# Altium footprint library MH_DA_THU_VIEN_16122016.PcbLib: 531 footprints (part 21 of 34)
Each footprint in its own frame and in the unit in brackets; x right, y up, seen from the top. Pads: shape width x height; smd on the part's side, far side on the other; paste and mask are expansions set on the pad; w line width, h text height; cw(c..) or ccw(c..) is an arc to the next point about the centre after c.
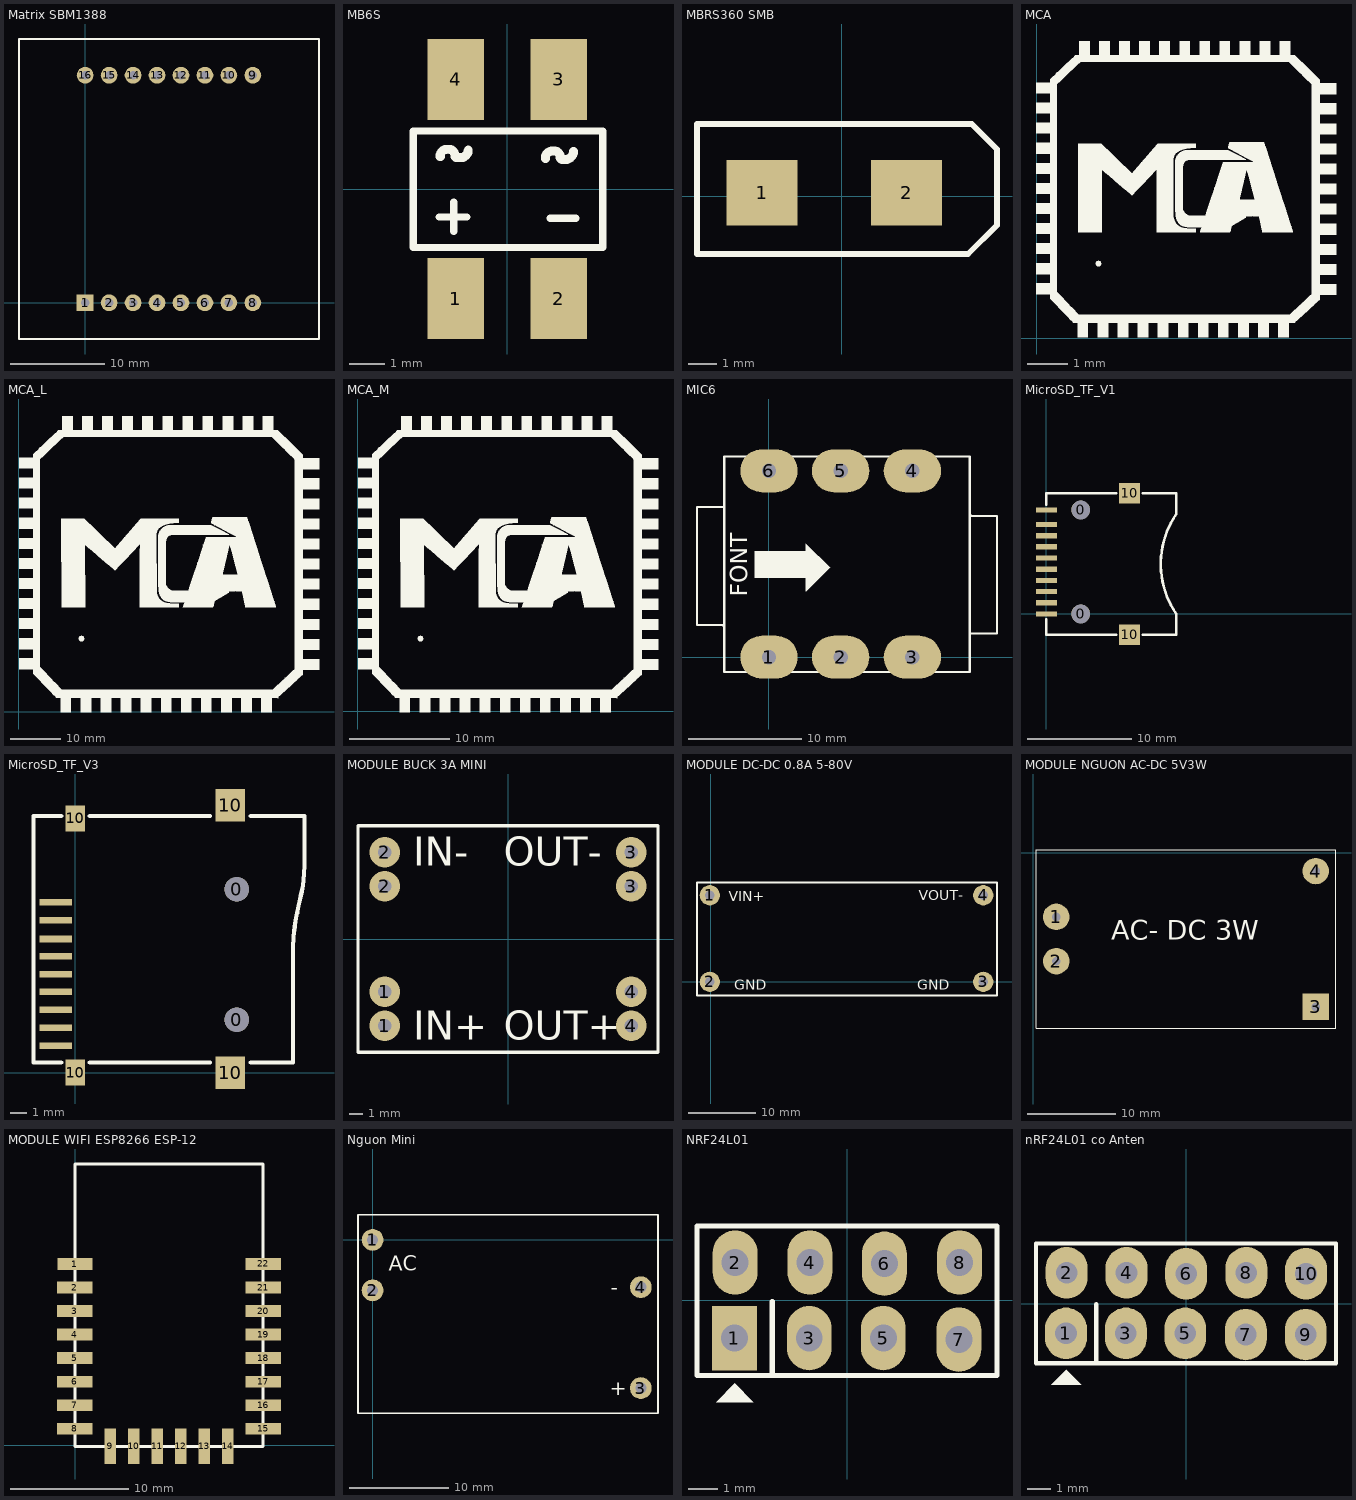
[diagram p20: the footprints below, top view; thin cyan lines are the x and y axes]

## Matrix SBM1388 [mil] "Matrix 8x8"
pads (16):
  rect 70x70 hole 35: 1(-1.1,0)
  round 70 hole 35: 2(98.9,0) 3(198.9,0) 4(298.9,0) 5(398.9,0) 6(498.9,0) 7(598.9,0) 8(698.9,0) 9(698.9,950) 10(598.9,950) 11(498.9,950) 12(398.9,950) 13(298.9,950) 14(198.9,950) 15(98.9,950) 16(-1.1,950)
Top Overlay:
  lines w10: -277.08,-150.98 -277.08,1100.98 974.88,1100.98 974.88,-150.98 -277.08,-150.98

## MB6S [mm]
pads (4):
  rect 1.6x2.3 smd: 1(-1.46,-3.111) 2(1.46,-3.111) 3(1.46,3.111) 4(-1.46,3.111)
Top Overlay:
  lines w0.203: -1.935,-0.8 -1.14,-0.8 ; -1.52,-1.21 -1.52,-0.369 ; 1.22,-0.83 1.95,-0.83 ; -2.67,-1.66 -2.67,1.65 2.71,1.65 2.71,-1.66 -2.67,-1.66
  lines w0.254: -1.9,0.92 cw(c-1.9,0.93) -1.91,0.93 cw(c-1.71,0.93) -1.71,1.13 -1.66,1.13 cw(c-1.66,0.96) -1.49,0.96 ccw(c-1.42,0.96) -1.42,0.89 -1.33,0.89 ccw(c-1.33,1.11) -1.11,1.11 ; 1.09,0.87 cw(c1.09,0.88) 1.08,0.88 cw(c1.28,0.88) 1.28,1.08 1.33,1.08 cw(c1.33,0.91) 1.5,0.91 ccw(c1.57,0.91) 1.57,0.84 1.66,0.84 ccw(c1.66,1.06) 1.88,1.06

## MBRS360 SMB [mm]
pads (2):
  rect 2.5x2.3 smd: 1(-2.794,0.127) 2(2.286,0.127)
Top Overlay:
  lines w0.203: -5.08,-2.032 4.445,-2.032 5.461,-1.016 5.461,1.651 4.572,2.54 -5.08,2.54 -5.08,-2.032
3D body: height 1.03, standoff -0.03, extent -3.011,-1.673 2.249,1.927

## MCA [mm] "MCA_Microcontroller Academy"
Top Overlay:
  drawing of 4940 lines, arcs and shapes, not listed

## MCA_L [mm]
Top Overlay:
  drawing of 4947 lines, arcs and shapes, not listed

## MCA_M [mm]
Top Overlay:
  drawing of 4947 lines, arcs and shapes, not listed

## MIC6 [mm] "Jac Mic 6 pin to"
pads (6):
  oval 5.08x3.81 hole 1.27: 1(0,0) 2(6.35,0) 3(12.7,0) 4(12.7,16.51) 5(6.35,16.51) 6(0,16.51)
Top Overlay:
  region: -1.27,9.373 -1.27,7.036 3.302,7.036 3.277,7.061 3.277,5.842 3.302,5.842 5.385,7.925 5.41,7.925 3.277,10.058 3.277,9.373
  lines w0.178: -3.962,-1.295 -3.962,17.755 ; -3.962,2.261 -3.962,13.335 -4.013,13.284 -6.375,13.284 -6.375,2.845 -4.115,2.845 -3.962,2.692 ; -3.962,17.78 17.78,17.78 17.78,14.986 ; -3.937,-1.321 -3.912,-1.295 -3.886,-1.321 17.78,-1.321 17.78,2.083 ; 17.78,12.675 17.932,12.522 20.193,12.522 20.193,2.083 17.831,2.083 17.78,2.032 17.78,15.088
  text "FONT" at -1.905,5.334 h1.52

## MicroSD_TF_V1 [mm]
pads (14):
  round 1.8 hole 1.8: 0(3.3,0) 0(3.3,10)
  rect 2x0.5 smd: 1(0,7.525) 2(0,6.45) 3(0,5.375) 4(0,4.3) 5(0,3.225) 6(0,2.15) 7(0,1.075) 8(0,0) 9(0,8.6) 10(0,10)
  rect 2x2 smd: 10(8,-2) 10(8,11.6)
Top Overlay:
  lines w0.254: 0,-0.5 0,-2 6.7,-2 ; 0,10.5 0,11.6 6.7,11.6 ; 9.3,-2 12.5,-2 12.5,0 cw(c19.43,4.8) 12.5,9.6 12.5,11.6 9.3,11.6

## MicroSD_TF_V3 [mm]
pads (15):
  round 1.5 hole 1.5: 0(9.9,3.25) 0(9.9,11.25)
  rect 2x0.4 smd: 1(-1.2,10.45) 2(-1.2,9.35) 3(-1.2,8.2) 4(-1.2,7.15) 5(-1.2,6.05) 6(-1.2,4.95) 7(-1.2,3.85) 8(-1.2,2.75) 9(-1.2,1.65)
  rect 1.2x1.6 smd: 10(0,0) 10(0,15.6)
  rect 1.8x2 smd: 10(9.5,0) 10(9.5,16.4)
Top Overlay:
  lines w0.254: -0.875,0.625 -2.575,0.625 -2.575,15.75 -0.875,15.75 ; 0.875,0.625 8.25,0.625 ; 0.875,15.75 8.25,15.75 ; 10.75,0.625 13.35,0.625 13.35,7.65 13.375,8.35 13.45,8.975 13.5,9.325 13.6,9.8 13.75,10.5 13.85,10.975 13.95,11.475 14.025,12.175 14.05,12.75 14.05,15.75 10.75,15.75
Bottom Solder:
  circle w0.013: c9.9,3.25 r0.6
  circle w0.013: c9.9,11.25 r0.6
3D body: height 1.86, standoff -0.59, extent -1.385,0.189 13.865,16.189

## MODULE BUCK 3A MINI [mil]
pads (8):
  round 90 hole 40: 1(-364.17,-255.91) 1(-364.17,-155.91) 2(-364.17,155.91) 2(-364.17,255.91) 3(364.17,155.91) 3(364.17,255.91) 4(364.17,-255.91) 4(364.17,-155.91)
Top Overlay:
  lines w10: -442.91,-334.65 442.91,-334.65 442.91,334.65 -442.91,334.65 -442.91,-334.65
  text "OUT+" at -12,-298 h85
  text "OUT-" at -12,216 h85
  text "IN-" at -280,216 h85
  text "IN+" at -280,-298 h85

## MODULE DC-DC 0.8A 5-80V [mm]
pads (4):
  round 3 hole 1.4: 1(-0.127,12.827) 2(-0.127,0) 3(40.386,0) 4(40.386,12.827)
Top Overlay:
  lines w0.254: -2.032,-2.032 -2.032,14.732 42.418,14.732 42.418,-2.032 -2.032,-2.032
  text "VIN+" at 2.667,11.938 h1.52
  text "GND" at 3.523,-1.143 h1.52
  text "GND" at 30.607,-1.143 h1.52
  text "VOUT-" at 30.861,12.065 h1.52

## MODULE NGUON AC-DC 5V3W [mm]
pads (4):
  round 3 hole 1: 1(2.61,-7.29) 2(2.62,-12.31) 4(32.02,-2.1)
  rect 3x3 hole 1: 3(32.02,-17.49)
Top Overlay:
  circle w0.025: c2.618,-7.298 r1
  circle w0.025: c2.618,-12.298 r1
  circle w0.025: c32.018,-2.098 r1
  circle w0.025: c32.018,-17.498 r1
  lines w0.025: 1.618,-12.298 3.618,-12.298 ; 1.618,-7.298 3.618,-7.298 ; 2.618,-13.298 2.618,-11.298 ; 2.618,-8.298 2.618,-6.298 ; 31.018,-17.498 33.018,-17.498 ; 31.018,-2.098 33.018,-2.098 ; 32.018,-18.498 32.018,-16.498 ; 32.018,-3.098 32.018,-1.098 ; 0.318,-19.898 34.318,-19.898 34.318,0.302 0.318,0.302 0.318,-19.898
  text "AC- DC 3W" at 8.86,-10.61 h3.81

## MODULE WIFI ESP8266 ESP-12 [mm] "MODULE WIFI ESP8266 ESP-12"
pads (22):
  rect 3x1 smd: 1(-0.01,15.39) 2(-0.02,13.4) 3(-0.02,11.4) 4(-0.02,9.4) 5(-0.02,7.4) 6(-0.02,5.4) 7(-0.02,3.4) 8(-0.02,1.4) 15(15.98,1.4) 16(15.98,3.4) 17(15.98,5.4) 18(15.98,7.4) 19(15.98,9.4) 20(15.98,11.4) 21(15.98,13.4) 22(15.98,15.4)
  rect 1x3 smd: 9(2.98,-0.1) 10(4.98,-0.1) 11(6.98,-0.1) 12(8.98,-0.1) 13(10.98,-0.1) 14(12.98,-0.1)
Top Overlay:
  lines w0.254: -0.02,-0.102 -0.02,23.898 15.98,23.898 15.98,-0.102 -0.02,-0.102
3D body: height 2.65, standoff -0.04, extent -0.035,-0.125 15.975,23.88

## Nguon Mini [mm]
pads (4):
  round 2.2 hole 1.1: 1(0,0) 2(0,-5.08) 3(27,-14.92) 4(27,-4.76)
Top Overlay:
  lines w0.178: -1.473,-17.46 28.73,-17.46 28.73,2.54 -1.473,2.54 -1.473,-17.46
  text "AC" at 1.6,-3.099 h1.52
  text "+" at 23.851,-15.621 h1.52
  text "-" at 23.978,-5.512 h1.52

## NRF24L01 [mil]
pads (8):
  rect 60x86 hole 36: 1(-150.5,-50.5)
  oval 60x86 hole 36: 2(-149.5,50.5) 3(-50.5,-50.5) 4(-49.5,50.5) 5(48.5,-50.5) 6(50,49) 7(149.5,-52.5) 8(150.5,50.5)
Top Overlay:
  region: -150,-111 -175,-136 -125,-136
  lines w7: -100,-100 -100,-2 ; -200.5,-100.5 200.5,-100.5 200.5,99.5 -200.5,99.5 -200.5,-0.5 -200.5,-100.5
3D body: height 492.13, standoff -94.94, extent -201.18,-118.9 389.37,1022.83

## nRF24L01 co Anten [mil]
pads (10):
  oval 70x86 hole 36: 1(-200.25,-49.5) 2(-199.25,51.5) 3(-100.25,-49.5) 4(-99.25,51.5) 5(-1.25,-49.5) 6(0.25,50) 7(99.75,-51.5) 8(100.75,51.5) 9(199.75,-51.5) 10(200.25,50)
Top Overlay:
  region: -199.75,-110 -224.75,-135 -174.75,-135
  lines w7: -149.75,-99 -149.75,-1 ; -250.25,-99.5 -250.25,0.5 -250.25,100.5 250.25,100.5 250.25,-99.5 -250.25,-99.5
3D body: height 500, standoff -87.07, extent -250.27,-100 340.28,1041.73